# Altium footprint library 陪测板.PcbLib: 72 footprints (part 2 of 5)
Each footprint in its own frame and in the unit in brackets; x right, y up, seen from the top. Pads: shape width x height; smd on the part's side, far side on the other; paste and mask are expansions set on the pad; w line width, h text height; cw(c..) or ccw(c..) is an arc to the next point about the centre after c.
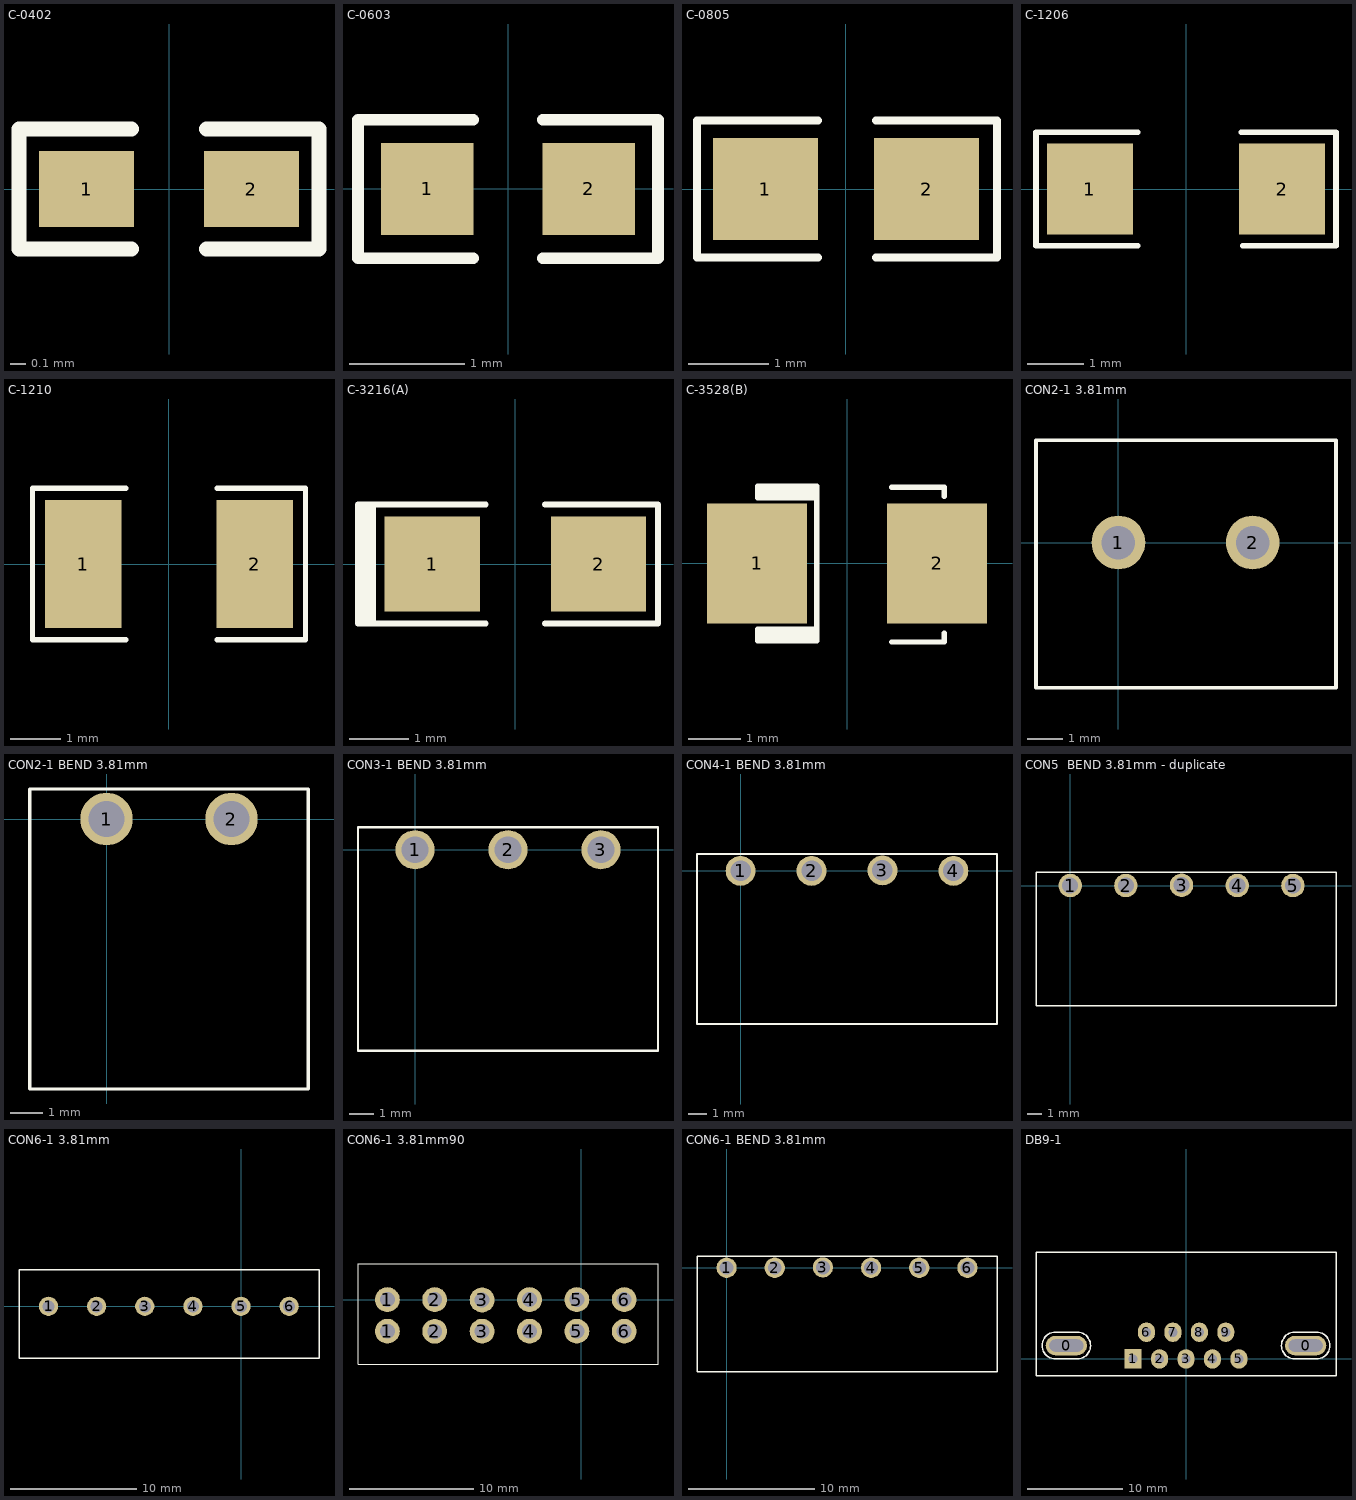
[diagram p1: the footprints below, top view; thin cyan lines are the x and y axes]

## C-0402 [mm]
pads (2):
  rect 0.635x0.508 smd: 1(-0.55,0) 2(0.55,0)
Top Overlay:
  lines w0.1: -0.25,-0.4 -1,-0.4 -1,0.4 -0.25,0.4 ; 0.25,-0.4 1,-0.4 1,0.4 0.25,0.4
3D body "C-0402(L1.0xW0.5xH0.5).STEP": height 0.49, standoff 0.01, extent -0.501,-0.25 0.486,0.237

## C-0603 [mm]
pads (2):
  rect 0.8x0.8 smd: 1(-0.7,0) 2(0.7,0)
Top Overlay:
  lines w0.1: -0.3,-0.6 -1.3,-0.6 -1.3,0.6 -0.3,0.6 ; 0.3,-0.6 1.3,-0.6 1.3,0.6 0.3,0.6
3D body "C-0603(1.6x0.8x0.8).STEP": height 0.8, standoff 0, extent -0.8,-0.4 0.8,0.4

## C-0805 [mm]
pads (2):
  rect 1.3x1.27 smd: 1(-1,0) 2(1,0)
Top Overlay:
  lines w0.1: -0.35,-0.85 -1.85,-0.85 -1.85,0.85 -0.35,0.85 ; 0.375,-0.85 1.875,-0.85 1.875,0.85 0.375,0.85
3D body "C-0805(2.0x1.25x1.25).STEP": height 1.25, standoff 0, extent -0.975,-0.625 1.025,0.625

## C-1206 [mm]
pads (2):
  rect 1.52x1.6 smd: 1(-1.7,0) 2(1.7,0)
Top Overlay:
  lines w0.1: -0.85,-1 -2.65,-1 -2.65,1 -0.85,1 ; 0.975,1 2.65,1 2.65,-1 1,-1
3D body "C-1206(3.2x1.6x1.6).STEP": height 1.6, standoff 0, extent -1.6,-0.875 1.6,0.725

## C-1210 [mm]
pads (2):
  rect 1.52x2.54 smd: 1(-1.7,0) 2(1.7,0)
Top Overlay:
  lines w0.1: -0.85,-1.5 -2.7,-1.5 -2.7,1.5 -0.85,1.5 ; 0.95,-1.5 2.7,-1.5 2.7,1.5 0.95,1.5
3D body "C-1210(3.2x2.5x2.5).STEP": height 2.5, standoff 0, extent -1.6,-1.2 1.6,1.3

## C-3216(A) [mm]
height 1.2
pads (2):
  rect 1.6x1.6 smd: 1(-1.4,0) 2(1.4,0)
Top Overlay:
  lines w0.1: -2.65,-1 -0.5,-1 ; -2.65,-0.975 -2.65,0.975 ; -2.65,1 -0.5,1 ; -2.55,-0.975 -2.55,0.975 ; -2.475,-0.975 -2.475,0.975 ; -2.4,-1 -2.4,1 ; 0.5,-1 2.4,-1 2.4,1 0.5,1
3D body "TAJ-A.STEP": height 1.6, standoff 0, extent -1.6,-0.8 1.6,0.8

## C-3528(B) [mil]
pads (2):
  rect 75x90 smd: 1(-67.52,0) 2(67.48,0)
Top Overlay:
  rectangle: -66.93,-58.06 -22.64,-47.23
  rectangle: -66.93,47.24 -22.64,58.07
  lines w3.94: -66.93,-49.21 -66.93,-58.07 -22.64,-58.07 -22.64,58.07 -66.93,58.07 -66.93,49.21 ; 33.46,-59.06 72.83,-59.06 72.83,-52.17 ; 33.46,57.09 72.83,57.09 72.83,50.2
3D body "TAJ-B.STEP": height 74.8, standoff 0, extent -67.91,-55.12 69.88,55.12

## CON2-1 3.81mm [mil]
pads (2):
  round 60 hole 37.4: 1(0,0) 2(150,0)
Top Overlay:
  lines w3.94: -92,-162 243,-162 243,114 -92,114 -92,-162

## CON2-1 BEND 3.81mm [mm]
pads (2):
  round 1.6 hole 1.1: 1(0,0) 2(3.81,0)
Top Overlay:
  lines w0.1: -2.337,-8.23 -2.337,0.914 6.147,0.914 6.147,-8.23 -2.337,-8.23

## CON3-1 BEND 3.81mm [mm]
pads (3):
  round 1.6 hole 1.1: 1(0,0) 2(3.81,0) 3(7.62,0)
Top Overlay:
  lines w0.1: -2.337,-8.23 9.957,-8.23 9.957,0.914 -2.337,0.914 -2.337,-8.23

## CON4-1 BEND 3.81mm [mm]
pads (4):
  round 1.6 hole 1.1: 1(0,0) 2(3.81,0) 3(7.62,0.025) 4(11.43,0)
Top Overlay:
  lines w0.1: -2.337,-8.23 -2.337,0.914 13.767,0.914 13.767,-8.23 -2.337,-8.23

## CON5  BEND 3.81mm - duplicate [mm]
pads (5):
  round 1.6 hole 1.1: 1(0,0) 2(3.81,0) 3(7.62,0.025) 4(11.43,0) 5(15.24,0)
Top Overlay:
  lines w0.1: -2.337,-8.23 -2.337,0.914 18.186,0.914 18.186,-1.372 18.186,-5.944 18.186,-8.23 -2.337,-8.23

## CON6-1 3.81mm [mil]
pads (6):
  round 60 hole 37.4: 1(-600,0) 2(-450,0) 3(-300,0) 4(-150,0) 5(0,0) 6(150,0)
Top Overlay:
  lines w3.94: -692,-162 243,-162 243,114 -692,114 -692,-162

## CON6-1 3.81mm90 [mm]
pads (12):
  round 2 hole 1.2: 1(-15.596,-2.54) 1(-15.596,0) 2(-11.786,-2.548) 2(-11.786,0) 3(-7.976,-2.54) 3(-7.976,-0.025) 4(-4.166,-2.54) 4(-4.166,0) 5(-0.356,-2.54) 5(-0.356,0) 6(3.454,-2.54) 6(3.454,0)
Top Overlay:
  lines w0.1: -17.958,-5.207 -17.958,2.896 6.172,2.896 6.172,-5.207 -17.958,-5.207

## CON6-1 BEND 3.81mm [mm]
pads (6):
  round 1.6 hole 1.1: 1(0,0) 2(3.81,0) 3(7.62,0.025) 4(11.43,0) 5(15.24,0) 6(19.05,0)
Top Overlay:
  lines w0.1: -2.337,-8.23 -2.337,0.914 21.387,0.914 21.387,-8.23 -2.337,-8.23

## DB9-1 [mil]
pads (11):
  oval 170x80 hole 50 slot 140 at 0 deg: 0(-493,55) 0(493,55)
  rect 70x80 hole 38: 1(-218,0)
  oval 70x80 hole 38: 2(-109,0) 3(0,0) 4(109,0) 5(218,0) 6(-163,110) 7(-54,110) 8(55,110) 9(164,110)
Top Overlay:
  lines w6: -618,-70 -618,440 618,440 618,-70 -618,-70 ; -538,0 cw(c-538,55) -538,110 -448,110 cw(c-448,55) -448,0 -538,0 ; 448,0 cw(c448,55) 448,110 538,110 cw(c538,55) 538,0 448,0